# Altium footprint library microbuilder.PCBLIB: 422 footprints (part 14 of 27)
Each footprint in its own frame and in the unit in brackets; x right, y up, seen from the top. Pads: shape width x height; smd on the part's side, far side on the other; paste and mask are expansions set on the pad; w line width, h text height; cw(c..) or ccw(c..) is an arc to the next point about the centre after c.
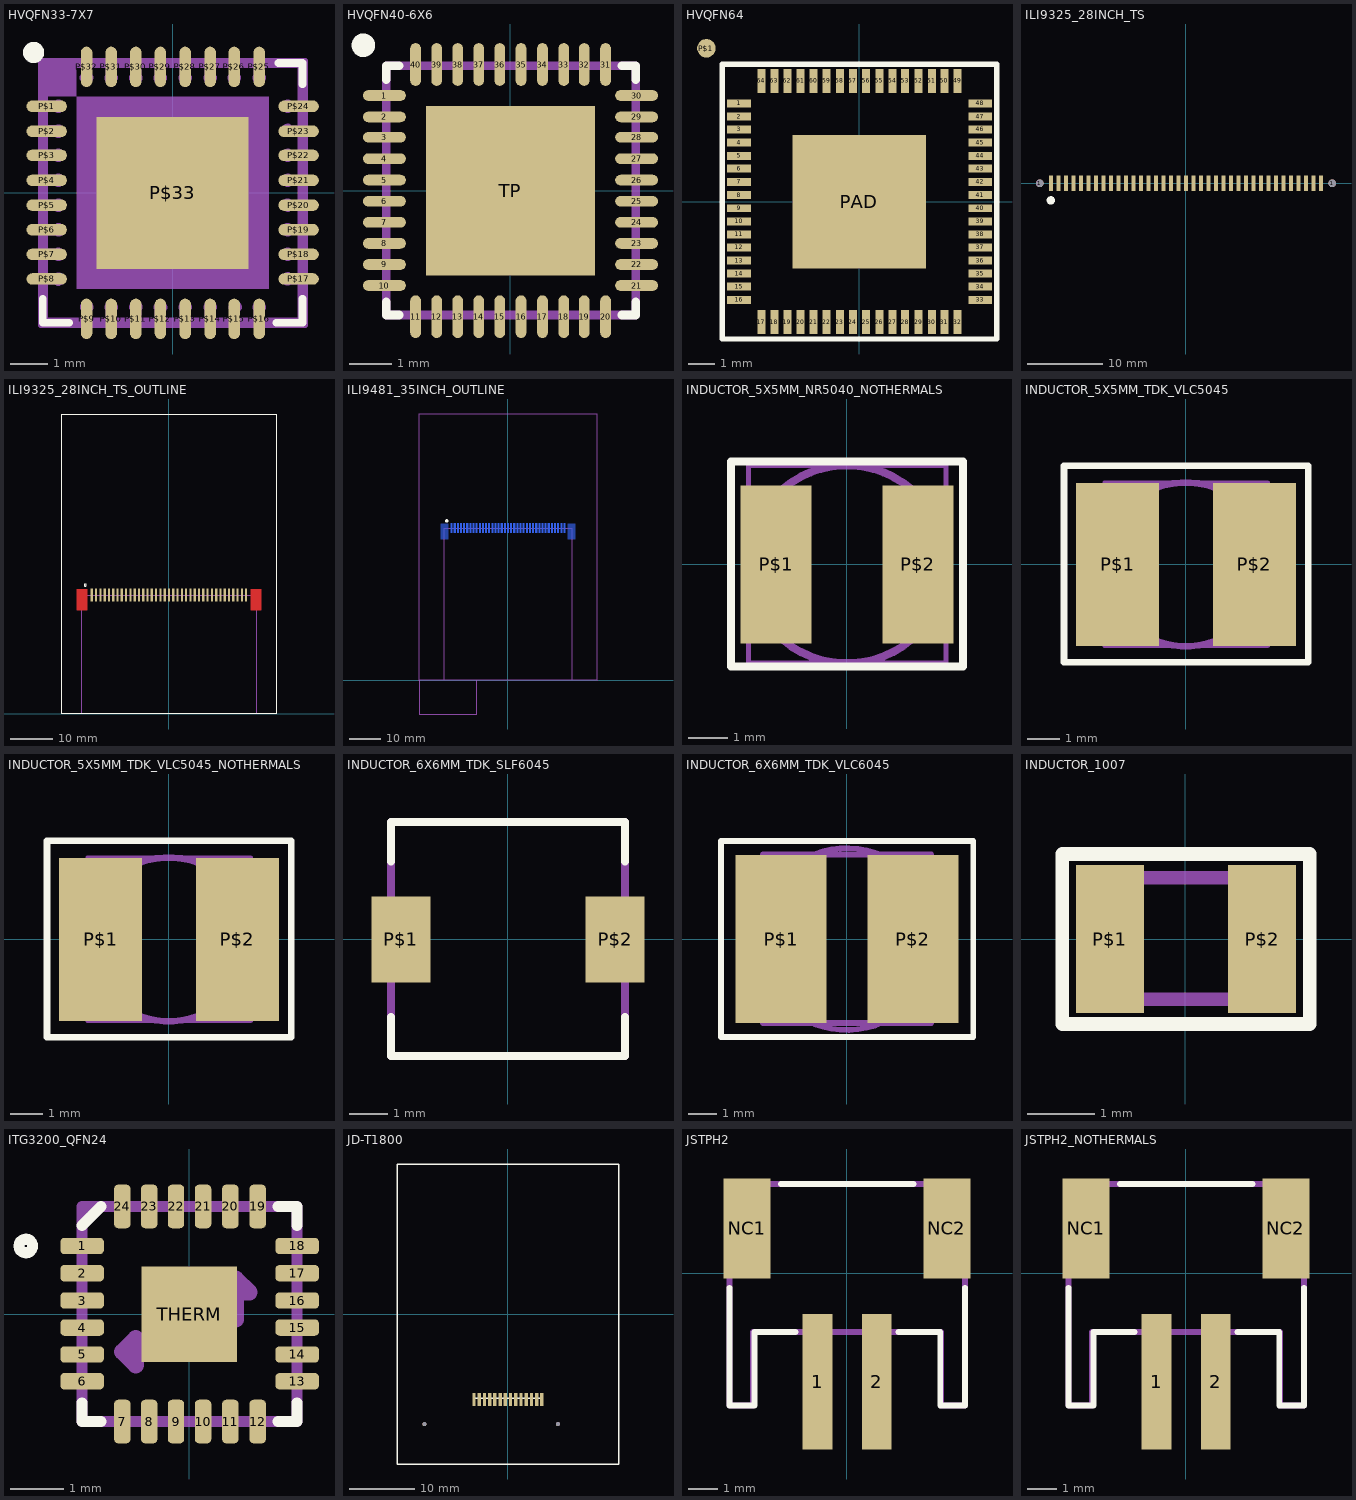
[diagram p13: the footprints below, top view; thin cyan lines are the x and y axes]

## HVQFN33-7X7 [mil]
pads (33):
  rrect100% 42x12 smd: P$1(-130.98,90) P$2(-130.98,64) P$3(-130.98,39) P$4(-130.98,13) P$5(-130.98,-12.8) P$6(-130.98,-38.39) P$7(-130.98,-63.98) P$8(-130.98,-89.57) P$17(131,-89.57) P$18(131,-63.98) P$19(131,-38.39) P$20(131,-12.8) P$21(131,13) P$22(131,39) P$23(131,64) P$24(131,90)
  rrect100% 12x42 smd: P$9(-89.57,-130.98) P$10(-63.98,-130.98) P$11(-38.39,-130.98) P$12(-12.8,-130.98) P$13(13,-130.98) P$14(39,-130.98) P$15(64,-130.98) P$16(90,-130.98) P$25(90,131) P$26(64,131) P$27(39,131) P$28(13,131) P$29(-12.8,131) P$30(-38.39,131) P$31(-63.98,131) P$32(-89.57,131)
  rect 158x158 smd: P$33(0,0)
Top Overlay:
  circle w12: c-144.59,146 r5
  lines w8: -135,-110 -135,-135 -107.5,-135 ; 108,-135 135,-135 135,-110 ; 110,135 135,135 135,113
Top Paste:
  rectangle: -68.9,30 -29.53,69
  rectangle: -19.68,30 20,69
  rectangle: 30,30 69,69
  rectangle: -68.9,-19.68 -29.53,20
  rectangle: -19.68,-19.68 20,20
  rectangle: 30,-19.68 69,20
  rectangle: -68.9,-68.9 -29.53,-29.53
  rectangle: -19.68,-68.9 20,-29.53
  rectangle: 30,-68.9 69,-29.53
Top Solder:
  circle w8: c-144.69,145 r15
Mechanical 16:
  rectangle: -135.83,100 -100,136
  region: -117.95,84.09 -117.95,95.91 -137.95,95.91 -137.95,84.09
  region: -118.45,58.59 -118.45,70.41 -137.45,70.41 -137.45,58.59
  region: -117.95,33.09 -117.95,44.91 -137.95,44.91 -137.95,33.09
  region: -117.95,7.09 -117.95,18.91 -137.95,18.91 -137.95,7.09
  region: -118.11,-18.7 -118.11,-6.89 -137.8,-6.89 -137.8,-18.7
  region: -118.11,-44.29 -118.11,-32.48 -137.8,-32.48 -137.8,-44.29
  region: -118.11,-69.88 -118.11,-58.07 -137.8,-58.07 -137.8,-69.88
  region: -118.11,-95.47 -118.11,-83.66 -137.8,-83.66 -137.8,-95.47
  region: -83.66,-118.11 -95.47,-118.11 -95.47,-137.8 -83.66,-137.8
  region: -58.07,-118.11 -69.88,-118.11 -69.88,-137.8 -58.07,-137.8
  region: -32.48,-118.11 -44.29,-118.11 -44.29,-137.8 -32.48,-137.8
  region: -6.89,-118.11 -18.7,-118.11 -18.7,-137.8 -6.89,-137.8
  region: 19,-118.11 7,-118.11 7,-137.8 19,-137.8
  region: 45,-118.11 33,-118.11 33,-137.8 45,-137.8
  region: 70,-118.11 59,-118.11 59,-137.8 70,-137.8
  region: 96,-118.11 84,-118.11 84,-137.8 96,-137.8
  region: 118.66,-84.07 118.66,-95.07 138.34,-95.07 138.34,-84.07
  region: 118.66,-58.48 118.66,-69.48 138.34,-69.48 138.34,-58.48
  region: 118.66,-32.89 118.66,-43.89 138.34,-43.89 138.34,-32.89
  region: 118.66,-7.3 118.66,-18.3 138.34,-18.3 138.34,-7.3
  region: 118.5,18.5 118.5,7.5 138.5,7.5 138.5,18.5
  region: 118.5,44.5 118.5,33.5 138.5,33.5 138.5,44.5
  region: 119,70 119,59 138,59 138,70
  region: 118.5,95.5 118.5,84.5 138.5,84.5 138.5,95.5
  rectangle: 84,119 96,138
  rectangle: 59,119 70,138
  rectangle: 33,119 45,138
  rectangle: 7,119 19,138
  rectangle: -18.7,119 -6.89,138
  rectangle: -44.29,119 -32.48,138
  rectangle: -69.88,119 -58.07,138
  rectangle: -95.47,119 -83.66,138
  lines w8: -119.29,-92.72 ccw(c-119.29,-89.67) -119.29,-86.61 ; -119.29,-67.13 ccw(c-119.29,-64.07) -119.29,-61.02 ; -119.29,-41.54 ccw(c-119.29,-38.48) -119.29,-35.43 ; -119.29,-15.94 ccw(c-119.29,-12.89) -119.29,-9.84 ; -119.29,10 ccw(c-119.29,13) -119.29,16 ; -119.29,36 ccw(c-119.29,39) -119.29,42 ; -119.29,61 ccw(c-119.29,64) -119.29,67 ; -119.29,87 ccw(c-119.29,90) -119.29,93 ; -92.72,120 ccw(c-89.67,120) -86.61,120 ; -92.52,-119.29 cw(c-89.47,-119.29) -86.42,-119.29 ; -67.13,120 ccw(c-64.07,120) -61.02,120 ; -66.93,-119.29 cw(c-63.88,-119.29) -60.83,-119.29 ; -41.54,120 ccw(c-38.48,120) -35.43,120 ; -41.34,-119.29 cw(c-38.29,-119.29) -35.24,-119.29 ; -15.94,120 ccw(c-12.89,120) -9.84,120 ; -15.75,-119.29 cw(c-12.7,-119.29) -9.65,-119.29 ; 10,-119.29 cw(c13,-119.29) 16,-119.29 ; 10,120 ccw(c13,120) 16,120 ; 36,-119.29 cw(c39,-119.29) 42,-119.29 ; 36,120 ccw(c39,120) 42,120 ; 61,120 ccw(c64,120) 67,120 ; 62,-119.29 cw(c65,-119.29) 68,-119.29 ; 87,-119.29 cw(c90,-119.29) 93,-119.29 ; 87,120 ccw(c90,120) 93,120 ; 120,-92.52 cw(c120,-89.47) 120,-86.42 ; 120,-66.93 cw(c120,-63.88) 120,-60.83 ; 120,-41.34 cw(c120,-38.29) 120,-35.24 ; 120,-15.75 cw(c120,-12.7) 120,-9.65 ; 120,10 cw(c120,13) 120,16 ; 120,36 cw(c120,39) 120,42 ; 120,62 cw(c120,65) 120,68 ; 120,87 cw(c120,90) 120,93 ; -133.86,-133.86 134,-133.86 134,134 -133.86,134 -133.86,-133.86 ; -92.52,-92.52 93,-92.52 93,93 -92.52,93 -92.52,-92.52
Mechanical 27:
  rectangle: -100,-100 100,100
  lines w5: -137.8,-137.8 -137.8,138 138,138 138,-137.8 -137.8,-137.8

## HVQFN40-6X6 [mil]
pads (41):
  rrect100% 40x10 smd: 1(-117.72,89) 2(-117.72,69) 3(-117.72,50) 4(-117.72,30) 5(-117.72,10) 6(-117.72,-9.84) 7(-117.72,-29.53) 8(-117.72,-49.21) 9(-117.72,-68.9) 10(-117.72,-88.58) 21(118,-88.58) 22(118,-68.9) 23(118,-49.21) 24(118,-29.53) 25(118,-9.84) 26(118,10) 27(118,30) 28(118,50) 29(118,69) 30(118,89)
  rrect100% 10x40 smd: 11(-88.58,-117.72) 12(-68.9,-117.72) 13(-49.21,-117.72) 14(-29.53,-117.72) 15(-9.84,-117.72) 16(10,-117.72) 17(30,-117.72) 18(50,-117.72) 19(69,-117.72) 20(89,-117.72) 31(89,118) 32(69,118) 33(50,118) 34(30,118) 35(10,118) 36(-9.84,118) 37(-29.53,118) 38(-49.21,118) 39(-68.9,118) 40(-88.58,118)
  rect 158x158 smd: TP(0,0)
Top Overlay:
  circle w12: c-137.4,136 r5
  lines w8: -116.14,-103.86 -116.14,-116.14 -103.86,-116.14 ; -116.14,104 -116.14,117 -103.86,117 ; 104,-116.14 117,-116.14 117,-103.86 ; 104,117 117,117 117,104
Top Paste:
  rectangle: -70.87,32 -31.5,71
  rectangle: -19.68,32 20,71
  rectangle: 32,32 71,71
  rectangle: -70.87,-19.68 -31.5,20
  rectangle: -70.87,-70.87 -31.5,-31.5
  rectangle: -19.68,-19.68 20,20
  rectangle: -19.68,-70.87 20,-31.5
  rectangle: 32,-70.87 71,-31.5
  rectangle: 32,-19.68 71,20
Mechanical 16:
  lines w8: -116.14,-116.14 -116.14,117 117,117 117,-116.14 -116.14,-116.14

## HVQFN64 [mil]
pads (66):
  rect 36x12 smd: 1(-181.1,148) 2(-181.1,128) 3(-181.1,109) 4(-181.1,89) 5(-181.1,69) 6(-181.1,50) 7(-181.1,30) 8(-181.1,10) 9(-181.1,-9.84) 10(-181.1,-29.53) 11(-181.1,-49.21) 12(-181.1,-68.9) 13(-181.1,-88.58) 14(-181.1,-108.27) 15(-181.1,-127.95) 16(-181.1,-147.64) 33(182,-147.64) 34(182,-127.95) 35(182,-108.27) 36(182,-88.58) 37(182,-68.9) 38(182,-49.21) 39(182,-29.53) 40(182,-9.84) 41(182,10) 42(182,30) 43(182,50) 44(182,69) 45(182,89) 46(182,109) 47(182,128) 48(182,148)
  rect 12x36 smd: 17(-147.64,-181.1) 18(-127.95,-181.1) 19(-108.27,-181.1) 20(-88.58,-181.1) 21(-68.9,-181.1) 22(-49.21,-181.1) 23(-29.53,-181.1) 24(-9.84,-181.1) 25(10,-181.1) 26(30,-181.1) 27(50,-181.1) 28(69,-181.1) 29(89,-181.1) 30(109,-181.1) 31(128,-181.1) 32(148,-181.1) 49(148,182) 50(128,182) 51(109,182) 52(89,182) 53(69,182) 54(50,182) 55(30,182) 56(10,182) 57(-9.84,182) 58(-29.53,182) 59(-49.21,182) 60(-68.9,182) 61(-88.58,182) 62(-108.27,182) 63(-127.95,182) 64(-147.64,182)
  rrect100% 28x28 smd: P$1(-230.31,231)
  rect 201x201 smd: PAD(0,0)
Top Overlay:
  lines w8: -206.69,-206.69 207,-206.69 207,207 -206.69,207 -206.69,-206.69

## ILI9325_28INCH_TS [mil]
pads (39):
  round 40 hole 40: 1(-767.72,0) 1(768,0)
  rect 20x79 smd: 1(-708.66,0) 2(-669.29,0) 3(-629.92,0) 4(-590.55,0) 5(-551.18,0) 6(-511.81,0) 7(-472.44,0) 8(-433.07,0) 9(-393.7,0) 10(-354.33,0) 11(-314.96,0) 12(-275.59,0) 13(-236.22,0) 14(-196.85,0) 15(-157.48,0) 16(-118.11,0) 17(-78.74,0) 18(-39.37,0) 19(0,0) 20(40,0) 21(79,0) 22(119,0) 23(158,0) 24(197,0) 25(237,0) 26(276,0) 27(315,0) 28(355,0) 29(394,0) 30(434,0) 31(473,0) 32(512,0) 33(552,0) 34(591,0) 35(630,0) 36(670,0) 37(709,0)
Top Overlay:
  circle w24: c-710,-90 r10
Via Holes:
  region: 0,0 10,0 10,10 0,10
  region: 0,0 10,0 10,10 0,10

## ILI9325_28INCH_TS_OUTLINE [mil]
pads (37):
  rect 20x119 smd: 1(-708.66,1094) 2(-669.29,1094) 3(-629.92,1094) 4(-590.55,1094) 5(-551.18,1094) 6(-511.81,1094) 7(-472.44,1094) 8(-433.07,1094) 9(-393.7,1094) 10(-354.33,1094) 11(-314.96,1094) 12(-275.59,1094) 13(-236.22,1094) 14(-196.85,1094) 15(-157.48,1094) 16(-118.11,1094) 17(-78.74,1094) 18(-39.37,1094) 19(0,1094) 20(40,1094) 21(79,1094) 22(119,1094) 23(158,1094) 24(197,1094) 25(237,1094) 26(276,1094) 27(315,1094) 28(355,1094) 29(394,1094) 30(434,1094) 31(473,1094) 32(512,1094) 33(552,1094) 34(591,1094) 35(630,1094) 36(670,1094) 37(709,1094)
Top Layer:
  rectangle: -850,950 -750,1150
  rectangle: 750,950 850,1150
Top Overlay:
  circle w8: c-769.06,1184 r10
  lines w8: -984.25,0 -984.25,2756 985,2756 985,0 800,0 -803.15,0 -984.25,0
Top Solder:
  rectangle: -850,950 -750,1150
  rectangle: 750,950 850,1150
Mechanical 16:
  lines w5: -984.25,0 -803.15,0 800,0 985,0 985,2756 -984.25,2756 -984.25,0
  lines w8: -803.15,0 -803.15,1090 804,1090 800,0
Via Holes:
  region: 0,0 10,0 10,10 0,10
  region: 0,0 10,0 10,10 0,10
  region: 0,0 10,0 10,10 0,10
  region: 0,0 10,0 10,10 0,10

## ILI9481_35INCH_OUTLINE [mil]
pads (37):
  rect 20x119 smd far side: 1(-708.66,1913) 2(-669.29,1913) 3(-629.92,1913) 4(-590.55,1913) 5(-551.18,1913) 6(-511.81,1913) 7(-472.44,1913) 8(-433.07,1913) 9(-393.7,1913) 10(-354.33,1913) 11(-314.96,1913) 12(-275.59,1913) 13(-236.22,1913) 14(-196.85,1913) 15(-157.48,1913) 16(-118.11,1913) 17(-78.74,1913) 18(-39.37,1913) 19(0,1913) 20(40,1913) 21(79,1913) 22(119,1913) 23(158,1913) 24(197,1913) 25(237,1913) 26(276,1913) 27(315,1913) 28(355,1913) 29(394,1913) 30(434,1913) 31(473,1913) 32(512,1913) 33(552,1913) 34(591,1913) 35(630,1913) 36(670,1913) 37(709,1913)
Bottom Layer:
  rectangle: -850,1769 -750,1969
  rectangle: 750,1769 850,1969
Top Overlay:
  circle w24: c-769.06,2003 r10
Bottom Solder:
  rectangle: -850,1769 -750,1969
  rectangle: 750,1769 850,1969
Via Holes:
  region: 0,0 10,0 10,10 0,10
  region: 0,0 10,0 10,10 0,10
  region: 0,0 10,0 10,10 0,10
  region: 0,0 10,0 10,10 0,10
Mechanical 30:
  lines w5: -393.7,0 -393.7,-423.23 -1112.99,-423.23 -1112.99,0 ; -1112.99,0 -803.15,0 ; -1112.99,0 -1112.99,3347 1113,3347 1113,0 804,0 ; -803.15,0 -803.15,1909 804,1909 804,0 ; -803.15,0 804,0

## INDUCTOR_5X5MM_NR5040_NOTHERMALS [mil]
pads (2):
  rect 71x158 smd: P$1(-70.87,0) P$2(71,0)
Top Overlay:
  lines w8: -115.67,-102.36 116,-102.36 116,103 -115.67,103 -115.67,-102.36
Mechanical 16:
  circle w8: c0,0 r99
  lines w5: -98.43,-98.43 99,-98.43 99,99 -98.43,99 -98.43,-98.43

## INDUCTOR_5X5MM_TDK_VLC5045 [mil]
pads (2):
  rect 100x197 smd: P$1(-82.52,0) P$2(83,0)
Top Overlay:
  lines w8: -147.17,-118.11 148,-118.11 148,119 -147.17,119 -147.17,-118.11
Mechanical 16:
  circle w8: c0,0 r99
  lines w5: -98.43,-98.43 99,-98.43 99,99 -98.43,99 -98.43,-98.43

## INDUCTOR_5X5MM_TDK_VLC5045_NOTHERMALS [mil]
pads (2):
  rect 100x197 smd: P$1(-82.52,0) P$2(83,0)
Top Overlay:
  lines w8: -147.17,-118.11 148,-118.11 148,119 -147.17,119 -147.17,-118.11
Mechanical 16:
  circle w8: c0,0 r99
  lines w5: -98.43,-98.43 99,-98.43 99,99 -98.43,99 -98.43,-98.43

## INDUCTOR_6X6MM_TDK_SLF6045 [mil]
pads (2):
  rect 60x87 smd: P$1(-108.27,0) P$2(109,0)
Top Overlay:
  lines w8: -118.11,-78.74 -118.11,-118.11 119,-118.11 119,-78.74 ; -118.11,79 -118.11,119 119,119 119,79
Mechanical 16:
  lines w5: -118.11,-118.11 119,-118.11 ; -118.11,119 119,119
  lines w8: -118.11,-118.11 -118.11,119 ; 119,-118.11 119,119

## INDUCTOR_6X6MM_TDK_VLC6045 [mil]
pads (2):
  rect 128x237 smd: P$1(-92.52,0) P$2(93,0)
Top Overlay:
  lines w8: -177.17,-137.8 178,-137.8 178,138 -177.17,138 -177.17,-137.8
Mechanical 16:
  circle w8: c0,0 r128
  lines w8: -118.11,-118.11 119,-118.11 119,119 -118.11,119 -118.11,-118.11

## INDUCTOR_1007 [mil]
pads (2):
  rect 40x87 smd: P$1(-44.37,0) P$2(45,0)
Top Overlay:
  lines w8: -72.5,-50 73,-50 73,50 -72.5,50 -72.5,-50
Mechanical 16:
  lines w8: -29.53,-35.43 -49.21,-35.43 -49.21,36 -29.53,36 ; -29.53,-35.43 30,-35.43 ; -29.53,-35.43 -29.53,36 ; -29.53,36 30,36 ; 30,-35.43 50,-35.43 50,36 30,36 ; 30,-35.43 30,36

## ITG3200_QFN24 [mil]
pads (25):
  rrect50% 32x12 smd: 1(-78.74,50) 2(-78.74,30) 3(-78.74,10) 4(-78.74,-9.84) 5(-78.74,-29.53) 6(-78.74,-49.21) 13(79,-49.21) 14(79,-29.53) 15(79,-9.84) 16(79,10) 17(79,30) 18(79,50)
  rrect50% 12x32 smd: 7(-49.21,-78.74) 8(-29.53,-78.74) 9(-9.84,-78.74) 10(10,-78.74) 11(30,-78.74) 12(50,-78.74) 19(50,79) 20(30,79) 21(10,79) 22(-9.84,79) 23(-29.53,79) 24(-49.21,79)
  rect 70x70 smd: THERM(0,0)
Top Overlay:
  circle w8: c-120,50 r5
  lines w8: -78.74,-64.96 -78.74,-78.74 -64.96,-78.74 ; -78.74,65 -64.96,79 ; 65,-78.74 79,-78.74 79,-64.96 ; 65,79 79,79 79,65
Top Paste:
  rectangle: 4,4 30,30
  rectangle: 4,-29.53 30,-3.94
  rectangle: -29.53,4 -3.94,30
  rectangle: -29.53,-29.53 -3.94,-3.94
Mechanical 16:
  circle w8: c-12.06,12 r16
  circle w8: c-12.06,13 r1
  lines w8: -78.74,-78.74 -78.74,79 79,79 79,-78.74 -78.74,-78.74
  lines w12: -19.68,-27.56 -49.21,-27.56 ; 34,-3.94 34,26 ; -49.21,-27.56 -39.37,-37.4 -39.37,-17.72 -49.21,-27.56 ; 34,26 24,16 44,16 34,26
  text "XY" at -6.06,-44.88 h49.6
  text "Z" at -23.28,51 h37.2

## JD-T1800 [mil]
pads (16):
  round 24 hole 24: 1(-503.94,-665.35) 1(302,-665.35)
  rect 20x79 smd: 1(205,-515.75) 2(174,-515.75) 3(142,-515.75) 4(111,-515.75) 5(79,-515.75) 6(48,-515.75) 7(16,-515.75) 8(-15.75,-515.75) 9(-47.24,-515.75) 10(-78.74,-515.75) 11(-110.24,-515.75) 12(-141.73,-515.75) 13(-173.23,-515.75) 14(-204.72,-515.75)
Top Overlay:
  lines w8: -204.72,-507.87 205,-507.87 ; -669.29,-905.51 670,-905.51 670,906 -669.29,906 -669.29,-905.51

## JSTPH2 [mil]
pads (4):
  rect 40x182 smd: 1(-39.37,-145.67) 2(40,-145.67)
  rect 63x134 smd: NC1(-133.86,60) NC2(134,60)
Top Overlay:
  lines w8: -157.48,-19.68 -157.48,-177.17 -124.02,-177.17 -124.02,-78.74 -68.9,-78.74 ; -88.58,119 89,119 ; 69,-78.74 125,-78.74 125,-177.17 158,-177.17 158,-19.68
Mechanical 16:
  lines w8: -157.48,-177.17 -157.48,119 158,119 158,-177.17 126,-177.17 126,-78.74 -125.98,-78.74 -125.98,-177.17 -157.48,-177.17

## JSTPH2_NOTHERMALS [mil]
pads (4):
  rect 40x182 smd: 1(-39.37,-145.67) 2(40,-145.67)
  rect 63x134 smd: NC1(-133.86,60) NC2(134,60)
Top Overlay:
  lines w8: -157.48,-19.68 -157.48,-177.17 -124.02,-177.17 -124.02,-78.74 -68.9,-78.74 ; -88.58,119 89,119 ; 69,-78.74 125,-78.74 125,-177.17 158,-177.17 158,-19.68
Mechanical 16:
  lines w8: -157.48,-177.17 -157.48,119 158,119 158,-177.17 126,-177.17 126,-78.74 -125.98,-78.74 -125.98,-177.17 -157.48,-177.17